# Altium integrated library Altium_WCAP-ATG8 (rev20b).IntLib: 195 symbols (part 2 of 2) (continued)
## 860010772002
designator C?, comment 0.22uF, 63V
WCAP-ATG8 Aluminum Electrolytic Capacitor, Radial, THT, D5xH11, 0.22uF, 63V; Manufacturer Part Number: 860010772002; Manufacturer: Wurth Elektronik; Ripple Current: 4mA; Rated Voltage: 63VDC; Technical Reference: ATBC110R22M063DSPA3B000; Leakage Current: 3uA; Endurance: 2000h; Dissipation Factor: 9%; Capacitance Tolerance: +/-20%; ComponentLink2Description: Datasheet; Published Date: October 2020; Packaging: Ammo Pack; Operating Temperature: -40 to +85degC; Mounting Technology: THT; Height: 11mm; Diameter: 5mm; ComponentLink2URL: https://www.we-online.com/catalog/datasheet/860010772002.pdf; ComponentLink1URL: http://www.we-online.de; ComponentLink1Description: Manufacturer; Capacitance: 0.22uF
footprint WCAP-ATG8_D5H11
pins: 1 P, 2 N

## 860010772003
designator C?, comment 0.33uF, 63V
WCAP-ATG8 Aluminum Electrolytic Capacitor, Radial, THT, D5xH11, 0.33uF, 63V; Manufacturer Part Number: 860010772003; Manufacturer: Wurth Elektronik; Ripple Current: 6mA; Rated Voltage: 63VDC; Technical Reference: ATBC110R33M063DSPA3B000; Leakage Current: 3uA; Endurance: 2000h; Dissipation Factor: 9%; Capacitance Tolerance: +/-20%; ComponentLink2Description: Datasheet; Published Date: October 2020; Packaging: Ammo Pack; Operating Temperature: -40 to +85degC; Mounting Technology: THT; Height: 11mm; Diameter: 5mm; ComponentLink2URL: https://www.we-online.com/catalog/datasheet/860010772003.pdf; ComponentLink1URL: http://www.we-online.de; ComponentLink1Description: Manufacturer; Capacitance: 0.33uF
footprint WCAP-ATG8_D5H11
pins: 1 P, 2 N

## 860010772004
designator C?, comment 0.47uF, 63V
WCAP-ATG8 Aluminum Electrolytic Capacitor, Radial, THT, D5xH11, 0.47uF, 63V; Manufacturer Part Number: 860010772004; Manufacturer: Wurth Elektronik; Ripple Current: 8mA; Rated Voltage: 63VDC; Technical Reference: ATBC110R47M063DSPA3B000; Leakage Current: 3uA; Endurance: 2000h; Dissipation Factor: 9%; Capacitance Tolerance: +/-20%; ComponentLink2Description: Datasheet; Published Date: October 2020; Packaging: Ammo Pack; Operating Temperature: -40 to +85degC; Mounting Technology: THT; Height: 11mm; Diameter: 5mm; ComponentLink2URL: https://www.we-online.com/catalog/datasheet/860010772004.pdf; ComponentLink1URL: http://www.we-online.de; ComponentLink1Description: Manufacturer; Capacitance: 0.47uF
footprint WCAP-ATG8_D5H11
pins: 1 P, 2 N

## 860010772005
designator C?, comment 1uF, 63V
WCAP-ATG8 Aluminum Electrolytic Capacitor, Radial, THT, D5xH11, 1uF, 63V; Manufacturer Part Number: 860010772005; Manufacturer: Wurth Elektronik; Ripple Current: 17mA; Rated Voltage: 63VDC; Technical Reference: ATBC110010M063DSPA3B000; Leakage Current: 3uA; Endurance: 2000h; Dissipation Factor: 9%; Capacitance Tolerance: +/-20%; ComponentLink2Description: Datasheet; Published Date: October 2020; Packaging: Ammo Pack; Operating Temperature: -40 to +85degC; Mounting Technology: THT; Height: 11mm; Diameter: 5mm; ComponentLink2URL: https://www.we-online.com/catalog/datasheet/860010772005.pdf; ComponentLink1URL: http://www.we-online.de; ComponentLink1Description: Manufacturer; Capacitance: 1uF
footprint WCAP-ATG8_D5H11
pins: 1 P, 2 N

## 860010772006
designator C?, comment 2.2uF, 63V
WCAP-ATG8 Aluminum Electrolytic Capacitor, Radial, THT, D5xH11, 2.2uF, 63V; Manufacturer Part Number: 860010772006; Manufacturer: Wurth Elektronik; Ripple Current: 31mA; Rated Voltage: 63VDC; Technical Reference: ATBC1102R2M063DSPA3B000; Leakage Current: 3uA; Endurance: 2000h; Dissipation Factor: 9%; Capacitance Tolerance: +/-20%; ComponentLink2Description: Datasheet; Published Date: October 2020; Packaging: Ammo Pack; Operating Temperature: -40 to +85degC; Mounting Technology: THT; Height: 11mm; Diameter: 5mm; ComponentLink2URL: https://www.we-online.com/catalog/datasheet/860010772006.pdf; ComponentLink1URL: http://www.we-online.de; ComponentLink1Description: Manufacturer; Capacitance: 2.2uF
footprint WCAP-ATG8_D5H11
pins: 1 P, 2 N

## 860010772007
designator C?, comment 3.3uF, 63V
WCAP-ATG8 Aluminum Electrolytic Capacitor, Radial, THT, D5xH11, 3.3uF, 63V; Manufacturer Part Number: 860010772007; Manufacturer: Wurth Elektronik; Ripple Current: 39mA; Rated Voltage: 63VDC; Technical Reference: ATBC1103R3M063DSPA3B000; Leakage Current: 3uA; Endurance: 2000h; Dissipation Factor: 9%; Capacitance Tolerance: +/-20%; ComponentLink2Description: Datasheet; Published Date: October 2020; Packaging: Ammo Pack; Operating Temperature: -40 to +85degC; Mounting Technology: THT; Height: 11mm; Diameter: 5mm; ComponentLink2URL: https://www.we-online.com/catalog/datasheet/860010772007.pdf; ComponentLink1URL: http://www.we-online.de; ComponentLink1Description: Manufacturer; Capacitance: 3.3uF
footprint WCAP-ATG8_D5H11
pins: 1 P, 2 N

## 860010772008
designator C?, comment 4.7uF, 63V
WCAP-ATG8 Aluminum Electrolytic Capacitor, Radial, THT, D5xH11, 4.7uF, 63V; Manufacturer Part Number: 860010772008; Manufacturer: Wurth Elektronik; Ripple Current: 50mA; Rated Voltage: 63VDC; Technical Reference: ATBC1104R7M063DSPA3B000; Leakage Current: 3uA; Endurance: 2000h; Dissipation Factor: 9%; Capacitance Tolerance: +/-20%; ComponentLink2Description: Datasheet; Published Date: October 2020; Packaging: Ammo Pack; Operating Temperature: -40 to +85degC; Mounting Technology: THT; Height: 11mm; Diameter: 5mm; ComponentLink2URL: https://www.we-online.com/catalog/datasheet/860010772008.pdf; ComponentLink1URL: http://www.we-online.de; ComponentLink1Description: Manufacturer; Capacitance: 4.7uF
footprint WCAP-ATG8_D5H11
pins: 1 P, 2 N

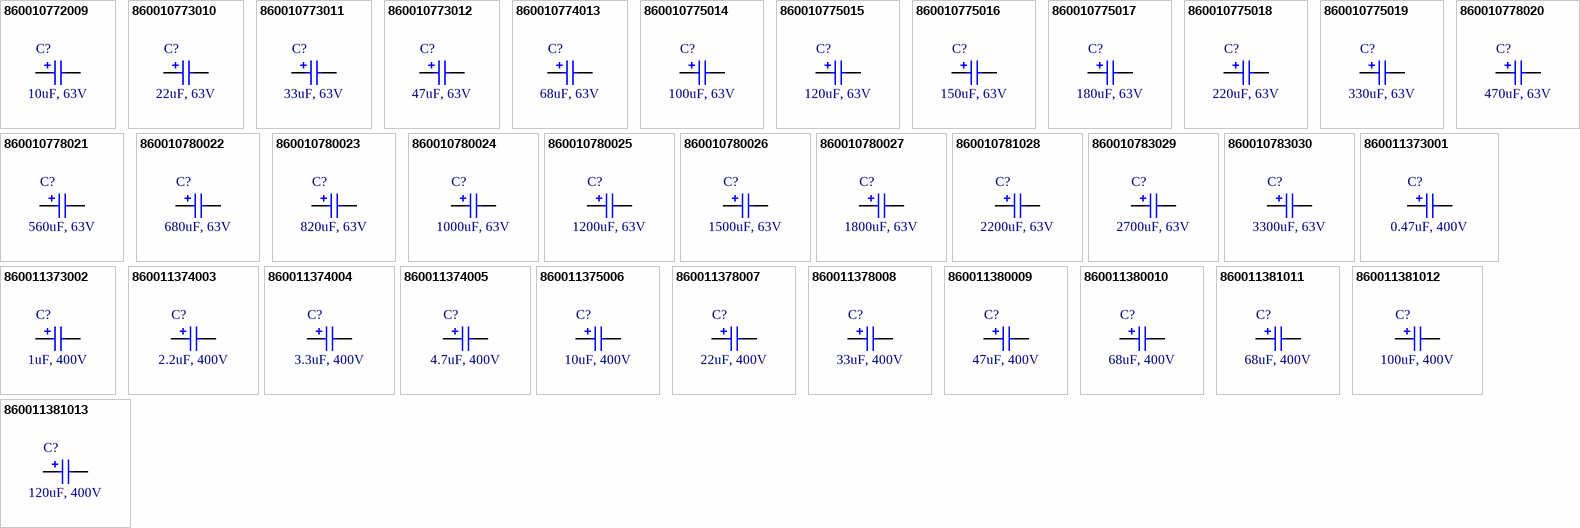
[diagram p4: symbols 860010772009 to 860011381013]

## 860010772009
designator C?, comment 10uF, 63V
WCAP-ATG8 Aluminum Electrolytic Capacitor, Radial, THT, D5xH11, 10uF, 63V; Manufacturer Part Number: 860010772009; Manufacturer: Wurth Elektronik; Ripple Current: 77mA; Rated Voltage: 63VDC; Technical Reference: ATBC110100M063DSPA3B000; Leakage Current: 6.3uA; Endurance: 2000h; Dissipation Factor: 9%; Capacitance Tolerance: +/-20%; ComponentLink2Description: Datasheet; Published Date: October 2020; Packaging: Ammo Pack; Operating Temperature: -40 to +85degC; Mounting Technology: THT; Height: 11mm; Diameter: 5mm; ComponentLink2URL: https://www.we-online.com/catalog/datasheet/860010772009.pdf; ComponentLink1URL: http://www.we-online.de; ComponentLink1Description: Manufacturer; Capacitance: 10uF
footprint WCAP-ATG8_D5H11
pins: 1 P, 2 N

## 860010773010
designator C?, comment 22uF, 63V
WCAP-ATG8 Aluminum Electrolytic Capacitor, Radial, THT, D6.3xH11, 22uF, 63V; Manufacturer Part Number: 860010773010; Manufacturer: Wurth Elektronik; Ripple Current: 127mA; Rated Voltage: 63VDC; Technical Reference: ATBD110220M063DSPA4B000; Leakage Current: 13.86uA; Endurance: 2000h; Dissipation Factor: 9%; Capacitance Tolerance: +/-20%; ComponentLink2Description: Datasheet; Published Date: October 2020; Packaging: Ammo Pack; Operating Temperature: -40 to +85degC; Mounting Technology: THT; Height: 11mm; Diameter: 6.3mm; ComponentLink2URL: https://www.we-online.com/catalog/datasheet/860010773010.pdf; ComponentLink1URL: http://www.we-online.de; ComponentLink1Description: Manufacturer; Capacitance: 22uF
footprint WCAP-ATG8_D6.3H11
pins: 1 P, 2 N

## 860010773011
designator C?, comment 33uF, 63V
WCAP-ATG8 Aluminum Electrolytic Capacitor, Radial, THT, D6.3xH11, 33uF, 63V; Manufacturer Part Number: 860010773011; Manufacturer: Wurth Elektronik; Ripple Current: 149mA; Rated Voltage: 63VDC; Technical Reference: ATBD110330M063DSPA4B000; Leakage Current: 20.79uA; Endurance: 2000h; Dissipation Factor: 9%; Capacitance Tolerance: +/-20%; ComponentLink2Description: Datasheet; Published Date: October 2020; Packaging: Ammo Pack; Operating Temperature: -40 to +85degC; Mounting Technology: THT; Height: 11mm; Diameter: 6.3mm; ComponentLink2URL: https://www.we-online.com/catalog/datasheet/860010773011.pdf; ComponentLink1URL: http://www.we-online.de; ComponentLink1Description: Manufacturer; Capacitance: 33uF
footprint WCAP-ATG8_D6.3H11
pins: 1 P, 2 N

## 860010773012
designator C?, comment 47uF, 63V
WCAP-ATG8 Aluminum Electrolytic Capacitor, Radial, THT, D6.3xH11, 47uF, 63V; Manufacturer Part Number: 860010773012; Manufacturer: Wurth Elektronik; Ripple Current: 198mA; Rated Voltage: 63VDC; Technical Reference: ATBD110470M063DSPA4B000; Leakage Current: 29.61uA; Endurance: 2000h; Dissipation Factor: 9%; Capacitance Tolerance: +/-20%; ComponentLink2Description: Datasheet; Published Date: October 2020; Packaging: Ammo Pack; Operating Temperature: -40 to +85degC; Mounting Technology: THT; Height: 11mm; Diameter: 6.3mm; ComponentLink2URL: https://www.we-online.com/catalog/datasheet/860010773012.pdf; ComponentLink1URL: http://www.we-online.de; ComponentLink1Description: Manufacturer; Capacitance: 47uF
footprint WCAP-ATG8_D6.3H11
pins: 1 P, 2 N

## 860010774013
designator C?, comment 68uF, 63V
WCAP-ATG8 Aluminum Electrolytic Capacitor, Radial, THT, D8xH11.5, 68uF, 63V; Manufacturer Part Number: 860010774013; Manufacturer: Wurth Elektronik; Ripple Current: 253mA; Rated Voltage: 63VDC; Technical Reference: ATBE115680M063DSPA7B000; Leakage Current: 42.84uA; Endurance: 2000h; Dissipation Factor: 9%; Capacitance Tolerance: +/-20%; ComponentLink2Description: Datasheet; Published Date: October 2020; Packaging: Ammo Pack; Operating Temperature: -40 to +85degC; Mounting Technology: THT; Height: 11.5mm; Diameter: 8mm; ComponentLink2URL: https://www.we-online.com/catalog/datasheet/860010774013.pdf; ComponentLink1URL: http://www.we-online.de; ComponentLink1Description: Manufacturer; Capacitance: 68uF
footprint WCAP-ATG8_D8H11.5
pins: 1 P, 2 N

## 860010775014
designator C?, comment 100uF, 63V
WCAP-ATG8 Aluminum Electrolytic Capacitor, Radial, THT, D10xH12.5, 100uF, 63V; Manufacturer Part Number: 860010775014; Manufacturer: Wurth Elektronik; Ripple Current: 330mA; Rated Voltage: 63VDC; Technical Reference: ATBF125101M063DSPA9B000; Leakage Current: 63uA; Endurance: 2000h; Dissipation Factor: 9%; Capacitance Tolerance: +/-20%; ComponentLink2Description: Datasheet; Published Date: October 2020; Packaging: Ammo Pack; Operating Temperature: -40 to +85degC; Mounting Technology: THT; Height: 12.5mm; Diameter: 10mm; ComponentLink2URL: https://www.we-online.com/catalog/datasheet/860010775014.pdf; ComponentLink1URL: http://www.we-online.de; ComponentLink1Description: Manufacturer; Capacitance: 100uF
footprint WCAP-ATG8_D10H12.5
pins: 1 P, 2 N

## 860010775015
designator C?, comment 120uF, 63V
WCAP-ATG8 Aluminum Electrolytic Capacitor, Radial, THT, D10xH16, 120uF, 63V; Manufacturer Part Number: 860010775015; Manufacturer: Wurth Elektronik; Ripple Current: 396mA; Rated Voltage: 63VDC; Technical Reference: ATBF160121M063DSPAAB000; Leakage Current: 75.6uA; Endurance: 2000h; Dissipation Factor: 9%; Capacitance Tolerance: +/-20%; ComponentLink2Description: Datasheet; Published Date: October 2020; Packaging: Ammo Pack; Operating Temperature: -40 to +85degC; Mounting Technology: THT; Height: 16mm; Diameter: 10mm; ComponentLink2URL: https://www.we-online.com/catalog/datasheet/860010775015.pdf; ComponentLink1URL: http://www.we-online.de; ComponentLink1Description: Manufacturer; Capacitance: 120uF
footprint WCAP-ATG8_D10H16
pins: 1 P, 2 N

## 860010775016
designator C?, comment 150uF, 63V
WCAP-ATG8 Aluminum Electrolytic Capacitor, Radial, THT, D10xH16, 150uF, 63V; Manufacturer Part Number: 860010775016; Manufacturer: Wurth Elektronik; Ripple Current: 462mA; Rated Voltage: 63VDC; Technical Reference: ATBF160151M063DSPAAB000; Leakage Current: 94.5uA; Endurance: 2000h; Dissipation Factor: 9%; Capacitance Tolerance: +/-20%; ComponentLink2Description: Datasheet; Published Date: October 2020; Packaging: Ammo Pack; Operating Temperature: -40 to +85degC; Mounting Technology: THT; Height: 16mm; Diameter: 10mm; ComponentLink2URL: https://www.we-online.com/catalog/datasheet/860010775016.pdf; ComponentLink1URL: http://www.we-online.de; ComponentLink1Description: Manufacturer; Capacitance: 150uF
footprint WCAP-ATG8_D10H16
pins: 1 P, 2 N

## 860010775017
designator C?, comment 180uF, 63V
WCAP-ATG8 Aluminum Electrolytic Capacitor, Radial, THT, D10xH16, 180uF, 63V; Manufacturer Part Number: 860010775017; Manufacturer: Wurth Elektronik; Ripple Current: 528mA; Rated Voltage: 63VDC; Technical Reference: ATBF160181M063DSPAAB000; Leakage Current: 113.4uA; Endurance: 2000h; Dissipation Factor: 9%; Capacitance Tolerance: +/-20%; ComponentLink2Description: Datasheet; Published Date: October 2020; Packaging: Ammo Pack; Operating Temperature: -40 to +85degC; Mounting Technology: THT; Height: 16mm; Diameter: 10mm; ComponentLink2URL: https://www.we-online.com/catalog/datasheet/860010775017.pdf; ComponentLink1URL: http://www.we-online.de; ComponentLink1Description: Manufacturer; Capacitance: 180uF
footprint WCAP-ATG8_D10H16
pins: 1 P, 2 N

## 860010775018
designator C?, comment 220uF, 63V
WCAP-ATG8 Aluminum Electrolytic Capacitor, Radial, THT, D10xH16, 220uF, 63V; Manufacturer Part Number: 860010775018; Manufacturer: Wurth Elektronik; Ripple Current: 550mA; Rated Voltage: 63VDC; Technical Reference: ATBF160221M063DSPAAB000; Leakage Current: 138.6uA; Endurance: 2000h; Dissipation Factor: 9%; Capacitance Tolerance: +/-20%; ComponentLink2Description: Datasheet; Published Date: October 2020; Packaging: Ammo Pack; Operating Temperature: -40 to +85degC; Mounting Technology: THT; Height: 16mm; Diameter: 10mm; ComponentLink2URL: https://www.we-online.com/catalog/datasheet/860010775018.pdf; ComponentLink1URL: http://www.we-online.de; ComponentLink1Description: Manufacturer; Capacitance: 220uF
footprint WCAP-ATG8_D10H16
pins: 1 P, 2 N

## 860010775019
designator C?, comment 330uF, 63V
WCAP-ATG8 Aluminum Electrolytic Capacitor, Radial, THT, D10xH20, 330uF, 63V; Manufacturer Part Number: 860010775019; Manufacturer: Wurth Elektronik; Ripple Current: 759mA; Rated Voltage: 63VDC; Technical Reference: ATBF200331M063DSPAAB000; Leakage Current: 207.9uA; Endurance: 2000h; Dissipation Factor: 9%; Capacitance Tolerance: +/-20%; ComponentLink2Description: Datasheet; Published Date: October 2020; Packaging: Ammo Pack; Operating Temperature: -40 to +85degC; Mounting Technology: THT; Height: 20mm; Diameter: 10mm; ComponentLink2URL: https://www.we-online.com/catalog/datasheet/860010775019.pdf; ComponentLink1URL: http://www.we-online.de; ComponentLink1Description: Manufacturer; Capacitance: 330uF
footprint WCAP-ATG8_D10H20
pins: 1 P, 2 N

## 860010778020
designator C?, comment 470uF, 63V
WCAP-ATG8 Aluminum Electrolytic Capacitor, Radial, THT, D13xH20, 470uF, 63V; Manufacturer Part Number: 860010778020; Manufacturer: Wurth Elektronik; Ripple Current: 968mA; Rated Voltage: 63VDC; Technical Reference: ATBI200471M063DSPACB000; Leakage Current: 296.1uA; Endurance: 2000h; Dissipation Factor: 9%; Capacitance Tolerance: +/-20%; ComponentLink2Description: Datasheet; Published Date: October 2020; Packaging: Ammo Pack; Operating Temperature: -40 to +85degC; Mounting Technology: THT; Height: 20mm; Diameter: 13mm; ComponentLink2URL: https://www.we-online.com/catalog/datasheet/860010778020.pdf; ComponentLink1URL: http://www.we-online.de; ComponentLink1Description: Manufacturer; Capacitance: 470uF
footprint WCAP-ATG8_D13H20
pins: 1 P, 2 N

## 860010778021
designator C?, comment 560uF, 63V
WCAP-ATG8 Aluminum Electrolytic Capacitor, Radial, THT, D13xH25, 560uF, 63V; Manufacturer Part Number: 860010778021; Manufacturer: Wurth Elektronik; Ripple Current: 1056mA; Rated Voltage: 63VDC; Technical Reference: ATBI250561M063DSPACB000; Leakage Current: 352.8uA; Endurance: 2000h; Dissipation Factor: 9%; Capacitance Tolerance: +/-20%; ComponentLink2Description: Datasheet; Published Date: October 2020; Packaging: Ammo Pack; Operating Temperature: -40 to +85degC; Mounting Technology: THT; Height: 25mm; Diameter: 13mm; ComponentLink2URL: https://www.we-online.com/catalog/datasheet/860010778021.pdf; ComponentLink1URL: http://www.we-online.de; ComponentLink1Description: Manufacturer; Capacitance: 560uF
footprint WCAP-ATG8_D13H25
pins: 1 P, 2 N

## 860010780022
designator C?, comment 680uF, 63V
WCAP-ATG8 Aluminum Electrolytic Capacitor, Radial, THT, D16xH25, 680uF, 63V; Manufacturer Part Number: 860010780022; Manufacturer: Wurth Elektronik; Ripple Current: 1265mA; Rated Voltage: 63VDC; Technical Reference: ATBK250681M063DSPAEB000; Leakage Current: 428.4uA; Endurance: 2000h; Dissipation Factor: 9%; Capacitance Tolerance: +/-20%; ComponentLink2Description: Datasheet; Published Date: October 2020; Packaging: Ammo Pack; Operating Temperature: -40 to +85degC; Mounting Technology: THT; Height: 25mm; Diameter: 16mm; ComponentLink2URL: https://www.we-online.com/catalog/datasheet/860010780022.pdf; ComponentLink1URL: http://www.we-online.de; ComponentLink1Description: Manufacturer; Capacitance: 680uF
footprint WCAP-ATG8_D16H25
pins: 1 P, 2 N

## 860010780023
designator C?, comment 820uF, 63V
WCAP-ATG8 Aluminum Electrolytic Capacitor, Radial, THT, D16xH25, 820uF, 63V; Manufacturer Part Number: 860010780023; Manufacturer: Wurth Elektronik; Ripple Current: 1430mA; Rated Voltage: 63VDC; Technical Reference: ATBK250821M063DSPAEB000; Leakage Current: 516.6uA; Endurance: 2000h; Dissipation Factor: 9%; Capacitance Tolerance: +/-20%; ComponentLink2Description: Datasheet; Published Date: October 2020; Packaging: Ammo Pack; Operating Temperature: -40 to +85degC; Mounting Technology: THT; Height: 25mm; Diameter: 16mm; ComponentLink2URL: https://www.we-online.com/catalog/datasheet/860010780023.pdf; ComponentLink1URL: http://www.we-online.de; ComponentLink1Description: Manufacturer; Capacitance: 820uF
footprint WCAP-ATG8_D16H25
pins: 1 P, 2 N

## 860010780024
designator C?, comment 1000uF, 63V
WCAP-ATG8 Aluminum Electrolytic Capacitor, Radial, THT, D16xH25, 1000uF, 63V; Manufacturer Part Number: 860010780024; Manufacturer: Wurth Elektronik; Ripple Current: 1540mA; Rated Voltage: 63VDC; Technical Reference: ATBK250102M063DSPAEB000; Leakage Current: 630uA; Endurance: 2000h; Dissipation Factor: 9%; Capacitance Tolerance: +/-20%; ComponentLink2Description: Datasheet; Published Date: October 2020; Packaging: Ammo Pack; Operating Temperature: -40 to +85degC; Mounting Technology: THT; Height: 25mm; Diameter: 16mm; ComponentLink2URL: https://www.we-online.com/catalog/datasheet/860010780024.pdf; ComponentLink1URL: http://www.we-online.de; ComponentLink1Description: Manufacturer; Capacitance: 1000uF
footprint WCAP-ATG8_D16H25
pins: 1 P, 2 N

## 860010780025
designator C?, comment 1200uF, 63V
WCAP-ATG8 Aluminum Electrolytic Capacitor, Radial, THT, D16xH31.5, 1200uF, 63V; Manufacturer Part Number: 860010780025; Manufacturer: Wurth Elektronik; Ripple Current: 1837mA; Rated Voltage: 63VDC; Technical Reference: ATBK315122M063DSPADB000; Leakage Current: 756uA; Endurance: 2000h; Dissipation Factor: 9%; Capacitance Tolerance: +/-20%; ComponentLink2Description: Datasheet; Published Date: October 2020; Packaging: Ammo Pack; Operating Temperature: -40 to +85degC; Mounting Technology: THT; Height: 31.5mm; Diameter: 16mm; ComponentLink2URL: https://www.we-online.com/catalog/datasheet/860010780025.pdf; ComponentLink1URL: http://www.we-online.de; ComponentLink1Description: Manufacturer; Capacitance: 1200uF
footprint WCAP-ATG8_D16H31.5
pins: 1 P, 2 N

## 860010780026
designator C?, comment 1500uF, 63V
WCAP-ATG8 Aluminum Electrolytic Capacitor, Radial, THT, D16xH35.5, 1500uF, 63V; Manufacturer Part Number: 860010780026; Manufacturer: Wurth Elektronik; Ripple Current: 2090mA; Rated Voltage: 63VDC; Technical Reference: ATBK355152M063DSPADB000; Leakage Current: 945uA; Endurance: 2000h; Dissipation Factor: 9%; Capacitance Tolerance: +/-20%; ComponentLink2Description: Datasheet; Published Date: October 2020; Packaging: Ammo Pack; Operating Temperature: -40 to +85degC; Mounting Technology: THT; Height: 35.5mm; Diameter: 16mm; ComponentLink2URL: https://www.we-online.com/catalog/datasheet/860010780026.pdf; ComponentLink1URL: http://www.we-online.de; ComponentLink1Description: Manufacturer; Capacitance: 1500uF
footprint WCAP-ATG8_D16H35.5
pins: 1 P, 2 N

## 860010780027
designator C?, comment 1800uF, 63V
WCAP-ATG8 Aluminum Electrolytic Capacitor, Radial, THT, D16xH35.5, 1800uF, 63V; Manufacturer Part Number: 860010780027; Manufacturer: Wurth Elektronik; Ripple Current: 2255mA; Rated Voltage: 63VDC; Technical Reference: ATBK355182M063DSPADB000; Leakage Current: 1134uA; Endurance: 2000h; Dissipation Factor: 9%; Capacitance Tolerance: +/-20%; ComponentLink2Description: Datasheet; Published Date: October 2020; Packaging: Ammo Pack; Operating Temperature: -40 to +85degC; Mounting Technology: THT; Height: 35.5mm; Diameter: 16mm; ComponentLink2URL: https://www.we-online.com/catalog/datasheet/860010780027.pdf; ComponentLink1URL: http://www.we-online.de; ComponentLink1Description: Manufacturer; Capacitance: 1800uF
footprint WCAP-ATG8_D16H35.5
pins: 1 P, 2 N

## 860010781028
designator C?, comment 2200uF, 63V
WCAP-ATG8 Aluminum Electrolytic Capacitor, Radial, THT, D18xH35.5, 2200uF, 63V; Manufacturer Part Number: 860010781028; Manufacturer: Wurth Elektronik; Ripple Current: 2475mA; Rated Voltage: 63VDC; Technical Reference: ATBL355222M063DSPAEB000; Leakage Current: 1386uA; Endurance: 2000h; Dissipation Factor: 9%; Capacitance Tolerance: +/-20%; ComponentLink2Description: Datasheet; Published Date: October 2020; Packaging: Ammo Pack; Operating Temperature: -40 to +85degC; Mounting Technology: THT; Height: 35.5mm; Diameter: 18mm; ComponentLink2URL: https://www.we-online.com/catalog/datasheet/860010781028.pdf; ComponentLink1URL: http://www.we-online.de; ComponentLink1Description: Manufacturer; Capacitance: 2200uF
footprint WCAP-ATG8_D18H35.5
pins: 1 P, 2 N

## 860010783029
designator C?, comment 2700uF, 63V
WCAP-ATG8 Aluminum Electrolytic Capacitor, Radial, THT, D22xH41, 2700uF, 63V; Manufacturer Part Number: 860010783029; Manufacturer: Wurth Elektronik; Ripple Current: 2860mA; Rated Voltage: 63VDC; Technical Reference: ATBN410272M063DSPS2B000; Leakage Current: 1701uA; Endurance: 2000h; Dissipation Factor: 9%; Capacitance Tolerance: +/-20%; ComponentLink2Description: Datasheet; Published Date: October 2020; Packaging: Ammo Pack; Operating Temperature: -40 to +85degC; Mounting Technology: THT; Height: 41mm; Diameter: 22mm; ComponentLink2URL: https://www.we-online.com/catalog/datasheet/860010783029.pdf; ComponentLink1URL: http://www.we-online.de; ComponentLink1Description: Manufacturer; Capacitance: 2700uF
footprint WCAP-ATG8_D22H41
pins: 1 P, 2 N

## 860010783030
designator C?, comment 3300uF, 63V
WCAP-ATG8 Aluminum Electrolytic Capacitor, Radial, THT, D22xH41, 3300uF, 63V; Manufacturer Part Number: 860010783030; Manufacturer: Wurth Elektronik; Ripple Current: 3080mA; Rated Voltage: 63VDC; Technical Reference: ATBN410332M063DSPS2B000; Leakage Current: 2079uA; Endurance: 2000h; Dissipation Factor: 9%; Capacitance Tolerance: +/-20%; ComponentLink2Description: Datasheet; Published Date: October 2020; Packaging: Ammo Pack; Operating Temperature: -40 to +85degC; Mounting Technology: THT; Height: 41mm; Diameter: 22mm; ComponentLink2URL: https://www.we-online.com/catalog/datasheet/860010783030.pdf; ComponentLink1URL: http://www.we-online.de; ComponentLink1Description: Manufacturer; Capacitance: 3300uF
footprint WCAP-ATG8_D22H41
pins: 1 P, 2 N

## 860011373001
designator C?, comment 0.47uF, 400V
WCAP-ATG8 Aluminum Electrolytic Capacitor, Radial, THT, D6.3xH11, 0.47uF, 400V; Manufacturer Part Number: 860011373001; Manufacturer: Wurth Elektronik; Ripple Current: 12mA; Rated Voltage: 400VDC; Technical Reference: ATAD110R47M400DSPA4B000; Leakage Current: 5.64uA; Endurance: 2000h; Dissipation Factor: 15%; Capacitance Tolerance: +/-20%; ComponentLink2Description: Datasheet; Published Date: October 2020; Packaging: Ammo Pack; Operating Temperature: -25 to +85degC; Mounting Technology: THT; Height: 11mm; Diameter: 6.3mm; ComponentLink2URL: https://www.we-online.com/catalog/datasheet/860011373001.pdf; ComponentLink1URL: http://www.we-online.de; ComponentLink1Description: Manufacturer; Capacitance: 0.47uF
footprint WCAP-ATG8_D6.3H11
pins: 1 P, 2 N

## 860011373002
designator C?, comment 1uF, 400V
WCAP-ATG8 Aluminum Electrolytic Capacitor, Radial, THT, D6.3xH11, 1uF, 400V; Manufacturer Part Number: 860011373002; Manufacturer: Wurth Elektronik; Ripple Current: 20mA; Rated Voltage: 400VDC; Technical Reference: ATAD110010M400DSPA4B000; Leakage Current: 12uA; Endurance: 2000h; Dissipation Factor: 15%; Capacitance Tolerance: +/-20%; ComponentLink2Description: Datasheet; Published Date: October 2020; Packaging: Ammo Pack; Operating Temperature: -25 to +85degC; Mounting Technology: THT; Height: 11mm; Diameter: 6.3mm; ComponentLink2URL: https://www.we-online.com/catalog/datasheet/860011373002.pdf; ComponentLink1URL: http://www.we-online.de; ComponentLink1Description: Manufacturer; Capacitance: 1uF
footprint WCAP-ATG8_D6.3H11
pins: 1 P, 2 N

## 860011374003
designator C?, comment 2.2uF, 400V
WCAP-ATG8 Aluminum Electrolytic Capacitor, Radial, THT, D8xH11.5, 2.2uF, 400V; Manufacturer Part Number: 860011374003; Manufacturer: Wurth Elektronik; Ripple Current: 32mA; Rated Voltage: 400VDC; Technical Reference: ATAE1152R2M400DSPA7B000; Leakage Current: 26.4uA; Endurance: 2000h; Dissipation Factor: 15%; Capacitance Tolerance: +/-20%; ComponentLink2Description: Datasheet; Published Date: October 2020; Packaging: Ammo Pack; Operating Temperature: -25 to +85degC; Mounting Technology: THT; Height: 11.5mm; Diameter: 8mm; ComponentLink2URL: https://www.we-online.com/catalog/datasheet/860011374003.pdf; ComponentLink1URL: http://www.we-online.de; ComponentLink1Description: Manufacturer; Capacitance: 2.2uF
footprint WCAP-ATG8_D8H11.5
pins: 1 P, 2 N

## 860011374004
designator C?, comment 3.3uF, 400V
WCAP-ATG8 Aluminum Electrolytic Capacitor, Radial, THT, D8xH11.5, 3.3uF, 400V; Manufacturer Part Number: 860011374004; Manufacturer: Wurth Elektronik; Ripple Current: 45mA; Rated Voltage: 400VDC; Technical Reference: ATAE1153R3M400DSPA7B000; Leakage Current: 39.6uA; Endurance: 2000h; Dissipation Factor: 15%; Capacitance Tolerance: +/-20%; ComponentLink2Description: Datasheet; Published Date: October 2020; Packaging: Ammo Pack; Operating Temperature: -25 to +85degC; Mounting Technology: THT; Height: 11.5mm; Diameter: 8mm; ComponentLink2URL: https://www.we-online.com/catalog/datasheet/860011374004.pdf; ComponentLink1URL: http://www.we-online.de; ComponentLink1Description: Manufacturer; Capacitance: 3.3uF
footprint WCAP-ATG8_D8H11.5
pins: 1 P, 2 N

## 860011374005
designator C?, comment 4.7uF, 400V
WCAP-ATG8 Aluminum Electrolytic Capacitor, Radial, THT, D8xH11.5, 4.7uF, 400V; Manufacturer Part Number: 860011374005; Manufacturer: Wurth Elektronik; Ripple Current: 55mA; Rated Voltage: 400VDC; Technical Reference: ATAE1154R7M400DSPA7B000; Leakage Current: 56.4uA; Endurance: 2000h; Dissipation Factor: 15%; Capacitance Tolerance: +/-20%; ComponentLink2Description: Datasheet; Published Date: October 2020; Packaging: Ammo Pack; Operating Temperature: -25 to +85degC; Mounting Technology: THT; Height: 11.5mm; Diameter: 8mm; ComponentLink2URL: https://www.we-online.com/catalog/datasheet/860011374005.pdf; ComponentLink1URL: http://www.we-online.de; ComponentLink1Description: Manufacturer; Capacitance: 4.7uF
footprint WCAP-ATG8_D8H11.5
pins: 1 P, 2 N

## 860011375006
designator C?, comment 10uF, 400V
WCAP-ATG8 Aluminum Electrolytic Capacitor, Radial, THT, D10xH16, 10uF, 400V; Manufacturer Part Number: 860011375006; Manufacturer: Wurth Elektronik; Ripple Current: 100mA; Rated Voltage: 400VDC; Technical Reference: ATAF160100M400DSPAAB000; Leakage Current: 120uA; Endurance: 2000h; Dissipation Factor: 15%; Capacitance Tolerance: +/-20%; ComponentLink2Description: Datasheet; Published Date: October 2020; Packaging: Ammo Pack; Operating Temperature: -25 to +85degC; Mounting Technology: THT; Height: 16mm; Diameter: 10mm; ComponentLink2URL: https://www.we-online.com/catalog/datasheet/860011375006.pdf; ComponentLink1URL: http://www.we-online.de; ComponentLink1Description: Manufacturer; Capacitance: 10uF
footprint WCAP-ATG8_D10H16
pins: 1 P, 2 N

## 860011378007
designator C?, comment 22uF, 400V
WCAP-ATG8 Aluminum Electrolytic Capacitor, Radial, THT, D13xH20, 22uF, 400V; Manufacturer Part Number: 860011378007; Manufacturer: Wurth Elektronik; Ripple Current: 190mA; Rated Voltage: 400VDC; Technical Reference: ATAI200220M400DSPACB000; Leakage Current: 264uA; Endurance: 2000h; Dissipation Factor: 15%; Capacitance Tolerance: +/-20%; ComponentLink2Description: Datasheet; Published Date: October 2020; Packaging: Ammo Pack; Operating Temperature: -25 to +85degC; Mounting Technology: THT; Height: 20mm; Diameter: 13mm; ComponentLink2URL: https://www.we-online.com/catalog/datasheet/860011378007.pdf; ComponentLink1URL: http://www.we-online.de; ComponentLink1Description: Manufacturer; Capacitance: 22uF
footprint WCAP-ATG8_D13H20
pins: 1 P, 2 N

## 860011378008
designator C?, comment 33uF, 400V
WCAP-ATG8 Aluminum Electrolytic Capacitor, Radial, THT, D13xH25, 33uF, 400V; Manufacturer Part Number: 860011378008; Manufacturer: Wurth Elektronik; Ripple Current: 230mA; Rated Voltage: 400VDC; Technical Reference: ATAI250330M400DSPACB000; Leakage Current: 396uA; Endurance: 2000h; Dissipation Factor: 15%; Capacitance Tolerance: +/-20%; ComponentLink2Description: Datasheet; Published Date: October 2020; Packaging: Ammo Pack; Operating Temperature: -25 to +85degC; Mounting Technology: THT; Height: 25mm; Diameter: 13mm; ComponentLink2URL: https://www.we-online.com/catalog/datasheet/860011378008.pdf; ComponentLink1URL: http://www.we-online.de; ComponentLink1Description: Manufacturer; Capacitance: 33uF
footprint WCAP-ATG8_D13H25
pins: 1 P, 2 N

## 860011380009
designator C?, comment 47uF, 400V
WCAP-ATG8 Aluminum Electrolytic Capacitor, Radial, THT, D16xH25, 47uF, 400V; Manufacturer Part Number: 860011380009; Manufacturer: Wurth Elektronik; Ripple Current: 270mA; Rated Voltage: 400VDC; Technical Reference: ATAK250470M400DSPAEB000; Leakage Current: 564uA; Endurance: 2000h; Dissipation Factor: 15%; Capacitance Tolerance: +/-20%; ComponentLink2Description: Datasheet; Published Date: October 2020; Packaging: Ammo Pack; Operating Temperature: -25 to +85degC; Mounting Technology: THT; Height: 25mm; Diameter: 16mm; ComponentLink2URL: https://www.we-online.com/catalog/datasheet/860011380009.pdf; ComponentLink1URL: http://www.we-online.de; ComponentLink1Description: Manufacturer; Capacitance: 47uF
footprint WCAP-ATG8_D16H25
pins: 1 P, 2 N

## 860011380010
designator C?, comment 68uF, 400V
WCAP-ATG8 Aluminum Electrolytic Capacitor, Radial, THT, D16xH35.5, 68uF, 400V; Manufacturer Part Number: 860011380010; Manufacturer: Wurth Elektronik; Ripple Current: 410mA; Rated Voltage: 400VDC; Technical Reference: ATAK355680M400DSPADB000; Leakage Current: 816uA; Endurance: 2000h; Dissipation Factor: 15%; Capacitance Tolerance: +/-20%; ComponentLink2Description: Datasheet; Published Date: October 2020; Packaging: Ammo Pack; Operating Temperature: -25 to +85degC; Mounting Technology: THT; Height: 35.5mm; Diameter: 16mm; ComponentLink2URL: https://www.we-online.com/catalog/datasheet/860011380010.pdf; ComponentLink1URL: http://www.we-online.de; ComponentLink1Description: Manufacturer; Capacitance: 68uF
footprint WCAP-ATG8_D16H35.5
pins: 1 P, 2 N

## 860011381011
designator C?, comment 68uF, 400V
WCAP-ATG8 Aluminum Electrolytic Capacitor, Radial, THT, D18xH25, 68uF, 400V; Manufacturer Part Number: 860011381011; Manufacturer: Wurth Elektronik; Ripple Current: 380mA; Rated Voltage: 400VDC; Technical Reference: ATAL250680M400DSPAEB000; Leakage Current: 816uA; Endurance: 2000h; Dissipation Factor: 15%; Capacitance Tolerance: +/-20%; ComponentLink2Description: Datasheet; Published Date: October 2020; Packaging: Ammo Pack; Operating Temperature: -25 to +85degC; Mounting Technology: THT; Height: 25mm; Diameter: 18mm; ComponentLink2URL: https://www.we-online.com/catalog/datasheet/860011381011.pdf; ComponentLink1URL: http://www.we-online.de; ComponentLink1Description: Manufacturer; Capacitance: 68uF
footprint WCAP-ATG8_D18H25
pins: 1 P, 2 N

## 860011381012
designator C?, comment 100uF, 400V
WCAP-ATG8 Aluminum Electrolytic Capacitor, Radial, THT, D18xH31.5, 100uF, 400V; Manufacturer Part Number: 860011381012; Manufacturer: Wurth Elektronik; Ripple Current: 440mA; Rated Voltage: 400VDC; Technical Reference: ATAL315101M400DSPAEB000; Leakage Current: 1200uA; Endurance: 2000h; Dissipation Factor: 15%; Capacitance Tolerance: +/-20%; ComponentLink2Description: Datasheet; Published Date: October 2020; Packaging: Ammo Pack; Operating Temperature: -25 to +85degC; Mounting Technology: THT; Height: 31.5mm; Diameter: 18mm; ComponentLink2URL: https://www.we-online.com/catalog/datasheet/860011381012.pdf; ComponentLink1URL: http://www.we-online.de; ComponentLink1Description: Manufacturer; Capacitance: 100uF
footprint WCAP-ATG8_D18H31.5
pins: 1 P, 2 N

## 860011381013
designator C?, comment 120uF, 400V
WCAP-ATG8 Aluminum Electrolytic Capacitor, Radial, THT, D18xH41, 120uF, 400V; Manufacturer Part Number: 860011381013; Manufacturer: Wurth Elektronik; Ripple Current: 520mA; Rated Voltage: 400VDC; Technical Reference: ATAL410121M400DSPS1B000; Leakage Current: 1440uA; Endurance: 2000h; Dissipation Factor: 15%; Capacitance Tolerance: +/-20%; ComponentLink2Description: Datasheet; Published Date: October 2020; Packaging: Ammo Pack; Operating Temperature: -25 to +85degC; Mounting Technology: THT; Height: 41mm; Diameter: 18mm; ComponentLink2URL: https://www.we-online.com/catalog/datasheet/860011381013.pdf; ComponentLink1URL: http://www.we-online.de; ComponentLink1Description: Manufacturer; Capacitance: 120uF
footprint WCAP-ATG8_D18H41
pins: 1 P, 2 N